# Altium schematic symbol library con-amp.SCHLIB: 238 symbols (part 2 of 3)
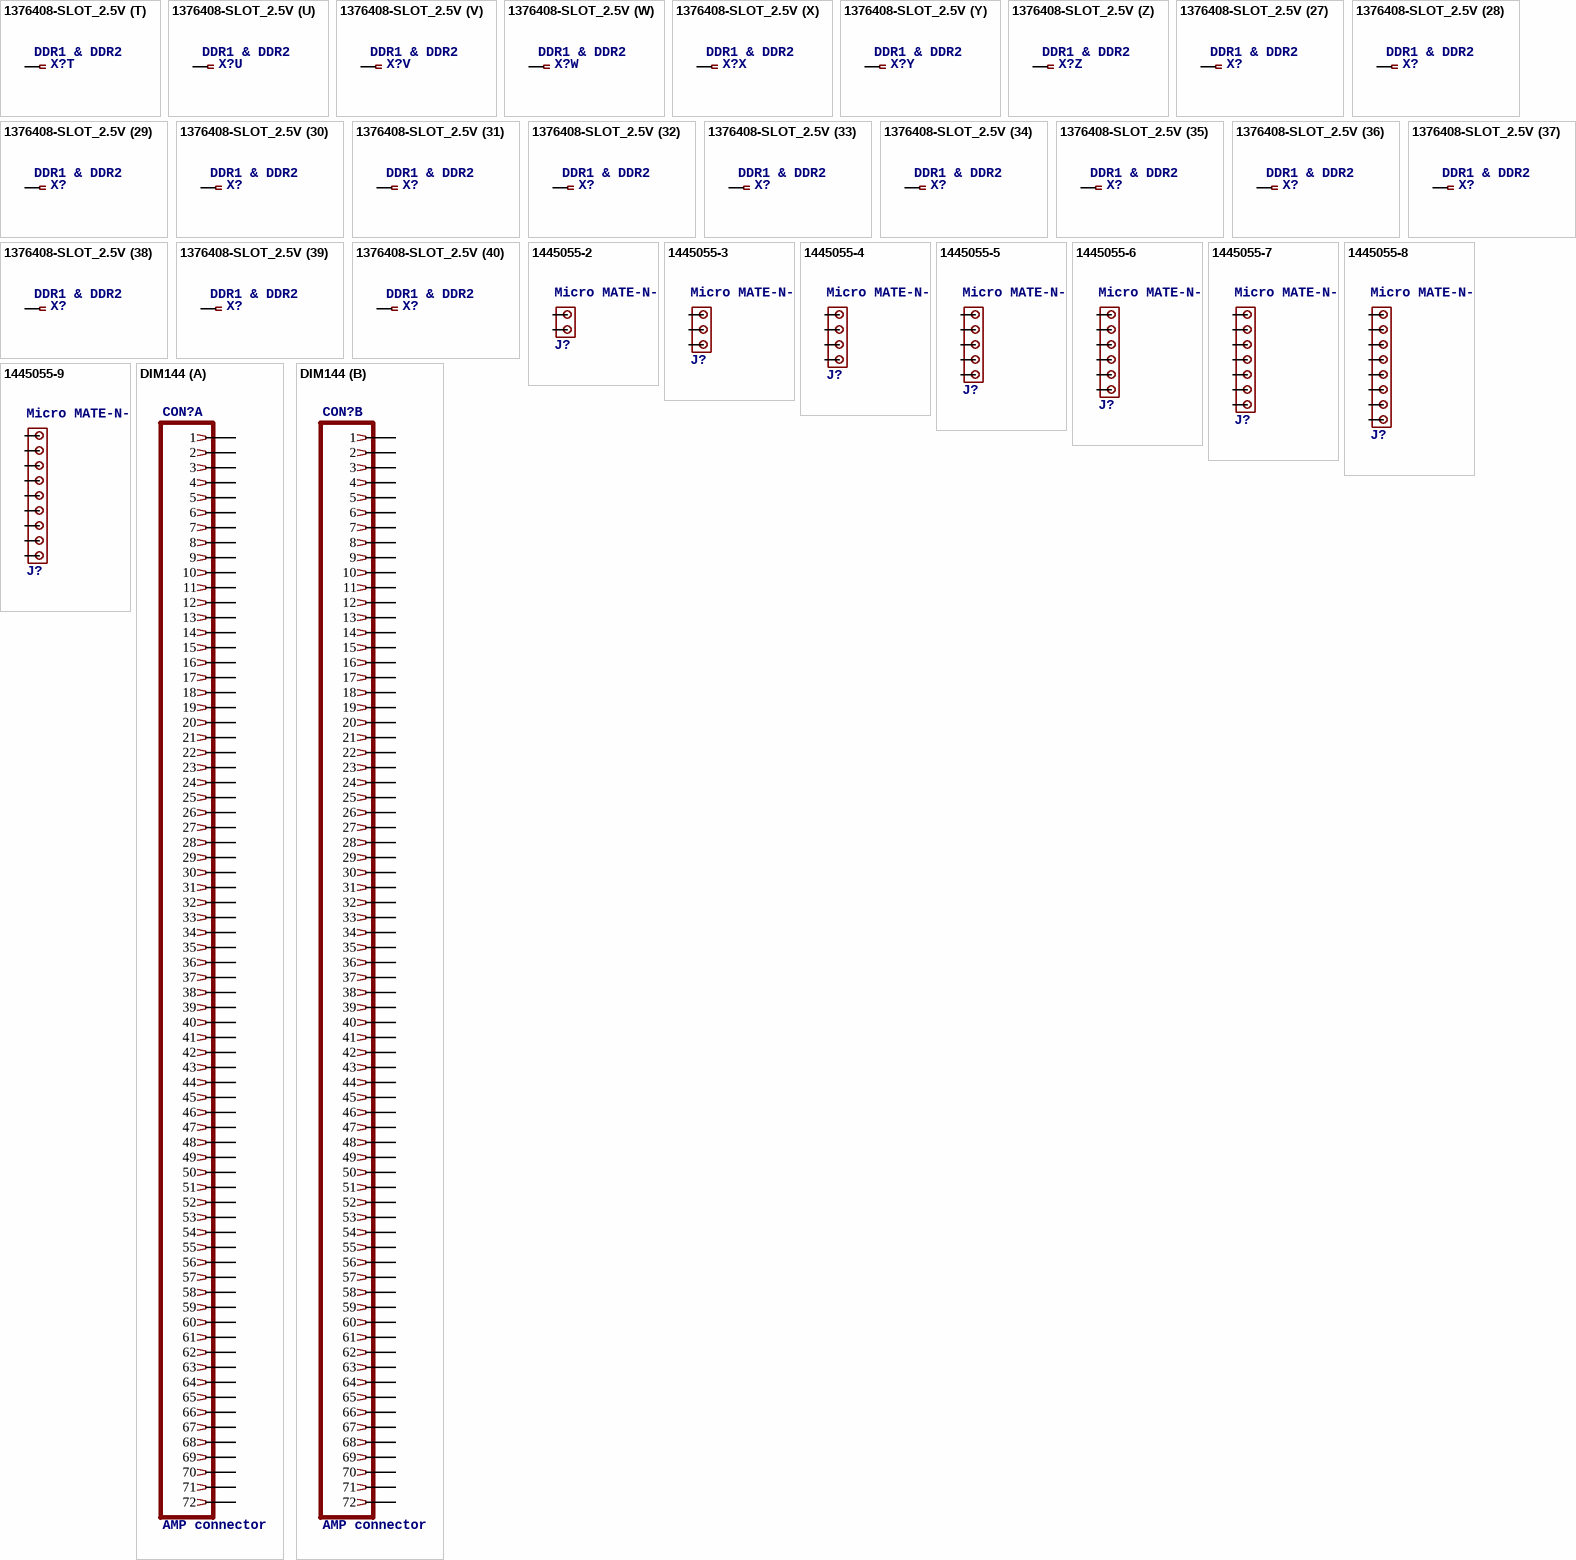
[diagram p35: symbols 1376408-SLOT_2.5V to DIM144]

## 1445055-5
designator J?, comment Micro MATE-N-LOK Connectors grid 1.5 mm   Source: ENG_CD_1445055_A.pdf
footprint 1445055-5
pins: 1, 2, 3, 4, 5

## 1445055-6
designator J?, comment Micro MATE-N-LOK Connectors grid 1.5 mm   Source: ENG_CD_1445055_A.pdf
footprint 1445055-6
pins: 1, 2, 3, 4, 5, 6

## 1445055-7
designator J?, comment Micro MATE-N-LOK Connectors grid 1.5 mm   Source: ENG_CD_1445055_A.pdf
footprint 1445055-7
pins: 1, 2, 3, 4, 5, 6, 7

## 1445055-8
designator J?, comment Micro MATE-N-LOK Connectors grid 1.5 mm   Source: ENG_CD_1445055_A.pdf
footprint 1445055-8
pins: 1, 2, 3, 4, 5, 6, 7, 8

## 1445055-9
designator J?, comment Micro MATE-N-LOK Connectors grid 1.5 mm   Source: ENG_CD_1445055_A.pdf
footprint 1445055-9
pins: 1, 2, 3, 4, 5, 6, 7, 8, 9

## DIM144
designator CON?, comment AMP connector
footprint 390110-1
part A pins: 1, 2, 3, 4, 5, 6, 7, 8, 9, 10, 11, 12, 13, 14, 15, 16, 17, 18, 19, 20, 21, 22, 23, 24, 25, 26, 27, 28, 29, 30, 31, 32, 33, 34, 35, 36, 37, 38, 39, 40, 41, 42, 43, 44, 45, 46, 47, 48, 49, 50, 51, 52, 53, 54, 55, 56, 57, 58, 59, 60, 61, 62, 63, 64, 65, 66, 67, 68, 69, 70, 71, 72
part B pins: 73 1, 74 2, 75 3, 76 4, 77 5, 78 6, 79 7, 80 8, 81 9, 82 10, 83 11, 84 12, 85 13, 86 14, 87 15, 88 16, 89 17, 90 18, 91 19, 92 20, 93 21, 94 22, 95 23, 96 24, 97 25, 98 26, 99 27, 100 28, 101 29, 102 30, 103 31, 104 32, 105 33, 106 34, 107 35, 108 36, 109 37, 110 38, 111 39, 112 40, 113 41, 114 42, 115 43, 116 44, 117 45, 118 46, 119 47, 120 48, 121 49, 122 50, 123 51, 124 52, 125 53, 126 54, 127 55, 128 56, 129 57, 130 58, 131 59, 132 60, 133 61, 134 62, 135 63, 136 64, 137 65, 138 66, 139 67, 140 68, 141 69, 142 70, 143 71, 144 72

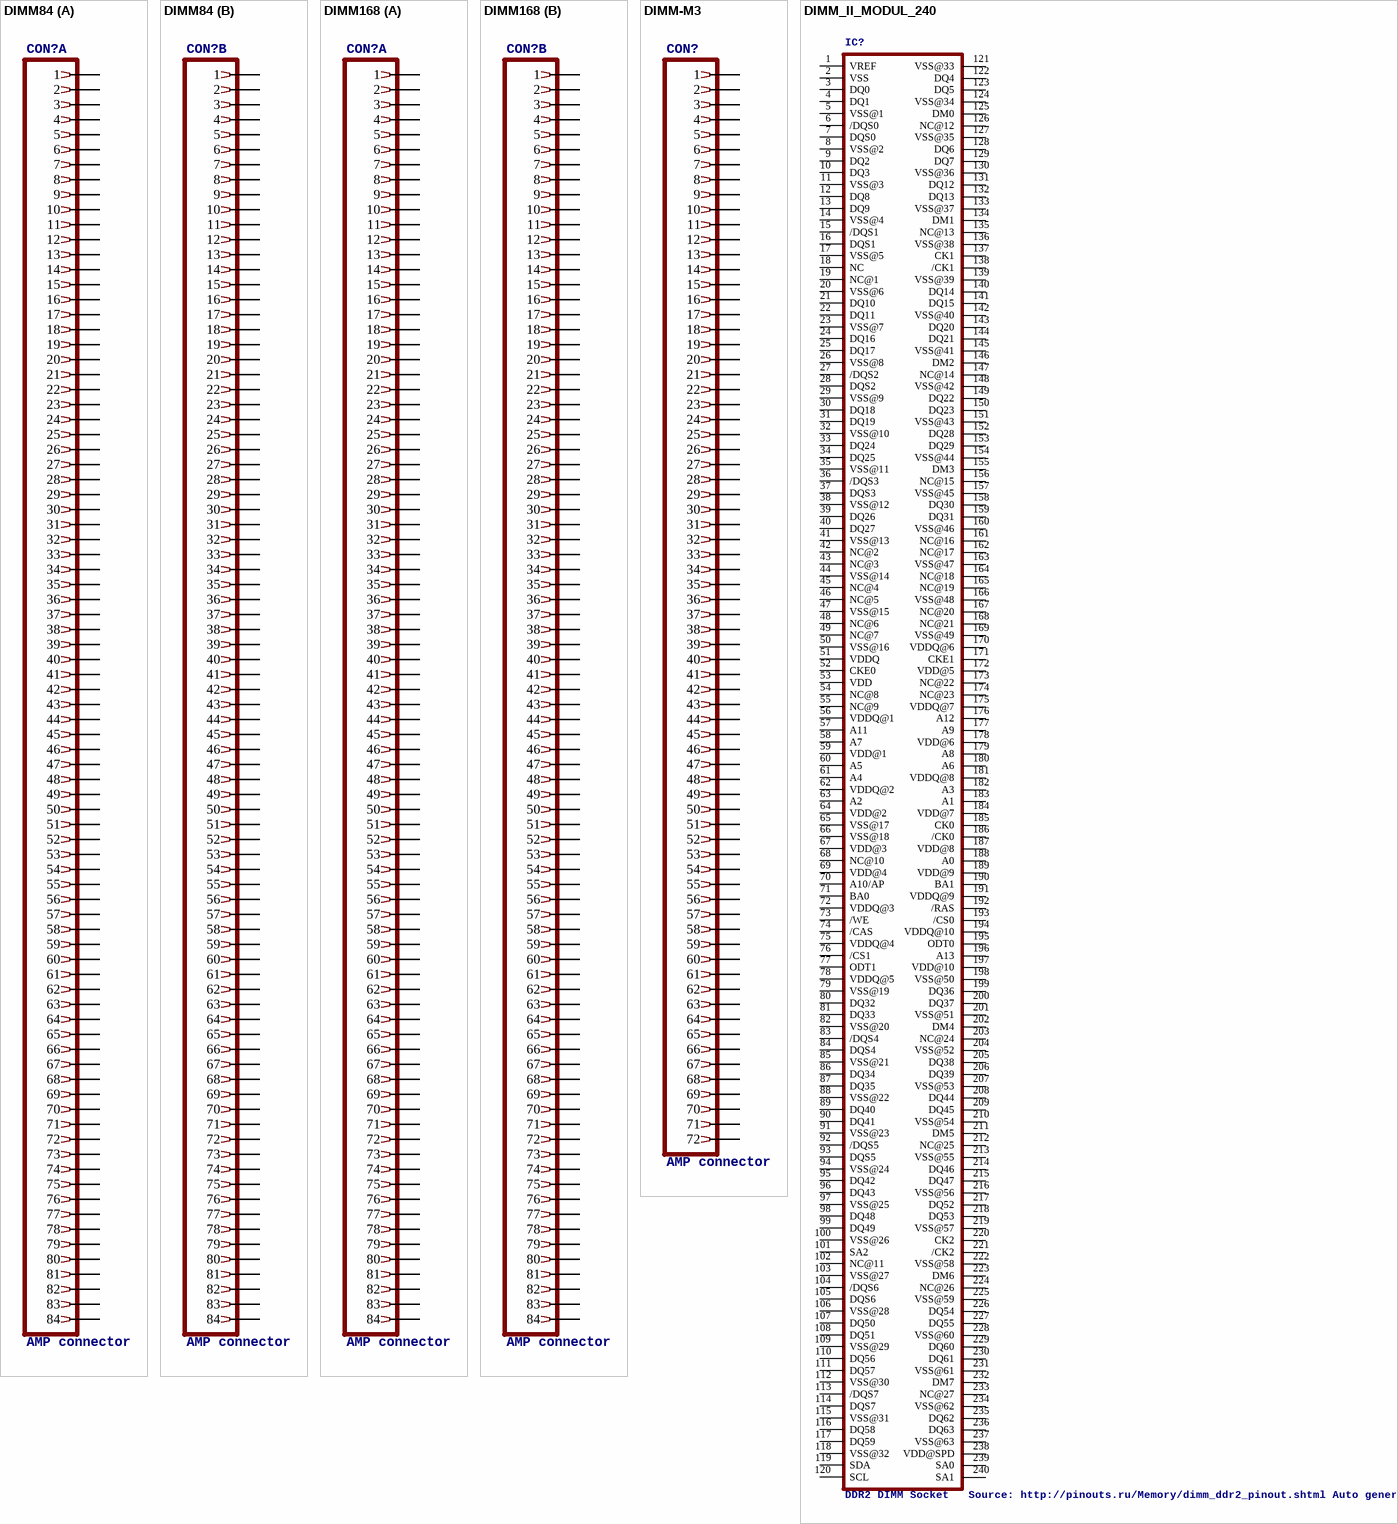
[diagram p11: symbols DIMM84 to DIMM_II_MODUL_240]

## DIMM84
designator CON?, comment AMP connector
footprint 382830-1
part A pins: 1, 2, 3, 4, 5, 6, 7, 8, 9, 10, 11, 12, 13, 14, 15, 16, 17, 18, 19, 20, 21, 22, 23, 24, 25, 26, 27, 28, 29, 30, 31, 32, 33, 34, 35, 36, 37, 38, 39, 40, 41, 42, 43, 44, 45, 46, 47, 48, 49, 50, 51, 52, 53, 54, 55, 56, 57, 58, 59, 60, 61, 62, 63, 64, 65, 66, 67, 68, 69, 70, 71, 72, 73, 74, 75, 76, 77, 78, 79, 80, 81, 82, 83, 84
part B pins: 85 1, 86 2, 87 3, 88 4, 89 5, 90 6, 91 7, 92 8, 93 9, 94 10, 95 11, 96 12, 97 13, 98 14, 99 15, 100 16, 101 17, 102 18, 103 19, 104 20, 105 21, 106 22, 107 23, 108 24, 109 25, 110 26, 111 27, 112 28, 113 29, 114 30, 115 31, 116 32, 117 33, 118 34, 119 35, 120 36, 121 37, 122 38, 123 39, 124 40, 125 41, 126 42, 127 43, 128 44, 129 45, 130 46, 131 47, 132 48, 133 49, 134 50, 135 51, 136 52, 137 53, 138 54, 139 55, 140 56, 141 57, 142 58, 143 59, 144 60, 145 61, 146 62, 147 63, 148 64, 149 65, 150 66, 151 67, 152 68, 153 69, 154 70, 155 71, 156 72, 157 73, 158 74, 159 75, 160 76, 161 77, 162 78, 163 79, 164 80, 165 81, 166 82, 167 83, 168 84

## DIMM168
designator CON?, comment AMP connector
footprint 390052-4
part A pins: 1, 2, 3, 4, 5, 6, 7, 8, 9, 10, 11, 12, 13, 14, 15, 16, 17, 18, 19, 20, 21, 22, 23, 24, 25, 26, 27, 28, 29, 30, 31, 32, 33, 34, 35, 36, 37, 38, 39, 40, 41, 42, 43, 44, 45, 46, 47, 48, 49, 50, 51, 52, 53, 54, 55, 56, 57, 58, 59, 60, 61, 62, 63, 64, 65, 66, 67, 68, 69, 70, 71, 72, 73, 74, 75, 76, 77, 78, 79, 80, 81, 82, 83, 84
part B pins: 85 1, 86 2, 87 3, 88 4, 89 5, 90 6, 91 7, 92 8, 93 9, 94 10, 95 11, 96 12, 97 13, 98 14, 99 15, 100 16, 101 17, 102 18, 103 19, 104 20, 105 21, 106 22, 107 23, 108 24, 109 25, 110 26, 111 27, 112 28, 113 29, 114 30, 115 31, 116 32, 117 33, 118 34, 119 35, 120 36, 121 37, 122 38, 123 39, 124 40, 125 41, 126 42, 127 43, 128 44, 129 45, 130 46, 131 47, 132 48, 133 49, 134 50, 135 51, 136 52, 137 53, 138 54, 139 55, 140 56, 141 57, 142 58, 143 59, 144 60, 145 61, 146 62, 147 63, 148 64, 149 65, 150 66, 151 67, 152 68, 153 69, 154 70, 155 71, 156 72, 157 73, 158 74, 159 75, 160 76, 161 77, 162 78, 163 79, 164 80, 165 81, 166 82, 167 83, 168 84

## DIMM-M3
designator CON?, comment AMP connector
footprint 177827-1
pins: 1, 2, 3, 4, 5, 6, 7, 8, 9, 10, 11, 12, 13, 14, 15, 16, 17, 18, 19, 20, 21, 22, 23, 24, 25, 26, 27, 28, 29, 30, 31, 32, 33, 34, 35, 36, 37, 38, 39, 40, 41, 42, 43, 44, 45, 46, 47, 48, 49, 50, 51, 52, 53, 54, 55, 56, 57, 58, 59, 60, 61, 62, 63, 64, 65, 66, 67, 68, 69, 70, 71, 72

## DIMM_II_MODUL_240
designator IC?, comment DDR2 DIMM Socket   Source: http://pinouts.ru/Memory/dimm_ddr2_pinout.shtml Auto generated by make-symbol-device-package-bsdl.ulp Rev. 20
footprint 1734773-DDR2
pins: 1 VREF, 2 VSS, 3 DQ0, 4 DQ1, 5 VSS@1, 6 /DQS0, 7 DQS0, 8 VSS@2, 9 DQ2, 10 DQ3, 11 VSS@3, 12 DQ8, 13 DQ9, 14 VSS@4, 15 /DQS1, 16 DQS1, 17 VSS@5, 18 NC, 19 NC@1, 20 VSS@6, 21 DQ10, 22 DQ11, 23 VSS@7, 24 DQ16, 25 DQ17, 26 VSS@8, 27 /DQS2, 28 DQS2, 29 VSS@9, 30 DQ18, 31 DQ19, 32 VSS@10, 33 DQ24, 34 DQ25, 35 VSS@11, 36 /DQS3, 37 DQS3, 38 VSS@12, 39 DQ26, 40 DQ27, 41 VSS@13, 42 NC@2, 43 NC@3, 44 VSS@14, 45 NC@4, 46 NC@5, 47 VSS@15, 48 NC@6, 49 NC@7, 50 VSS@16, 51 VDDQ, 52 CKE0, 53 VDD, 54 NC@8, 55 NC@9, 56 VDDQ@1, 57 A11, 58 A7, 59 VDD@1, 60 A5, 61 A4, 62 VDDQ@2, 63 A2, 64 VDD@2, 65 VSS@17, 66 VSS@18, 67 VDD@3, 68 NC@10, 69 VDD@4, 70 A10/AP, 71 BA0, 72 VDDQ@3, 73 /WE, 74 /CAS, 75 VDDQ@4, 76 /CS1, 77 ODT1, 78 VDDQ@5, 79 VSS@19, 80 DQ32, 81 DQ33, 82 VSS@20, 83 /DQS4, 84 DQS4, 85 VSS@21, 86 DQ34, 87 DQ35, 88 VSS@22, 89 DQ40, 90 DQ41, 91 VSS@23, 92 /DQS5, 93 DQS5, 94 VSS@24, 95 DQ42, 96 DQ43, 97 VSS@25, 98 DQ48, 99 DQ49, 100 VSS@26, 101 SA2, 102 NC@11, 103 VSS@27, 104 /DQS6, 105 DQS6, 106 VSS@28, 107 DQ50, 108 DQ51, 109 VSS@29, 110 DQ56, 111 DQ57, 112 VSS@30, 113 /DQS7, 114 DQS7, 115 VSS@31, 116 DQ58, 117 DQ59, 118 VSS@32, 119 SDA, 120 SCL, 121 VSS@33, 122 DQ4, 123 DQ5, 124 VSS@34, 125 DM0, 126 NC@12, 127 VSS@35, 128 DQ6, 129 DQ7, 130 VSS@36, 131 DQ12, 132 DQ13, 133 VSS@37, 134 DM1, 135 NC@13, 136 VSS@38, 137 CK1, 138 /CK1, 139 VSS@39, 140 DQ14, 141 DQ15, 142 VSS@40, 143 DQ20, 144 DQ21, 145 VSS@41, 146 DM2, 147 NC@14, 148 VSS@42, 149 DQ22, 150 DQ23, 151 VSS@43, 152 DQ28, 153 DQ29, 154 VSS@44, 155 DM3, 156 NC@15, 157 VSS@45, 158 DQ30, 159 DQ31, 160 VSS@46, 161 NC@16, 162 NC@17, 163 VSS@47, 164 NC@18, 165 NC@19, 166 VSS@48, 167 NC@20, 168 NC@21, 169 VSS@49, 170 VDDQ@6, 171 CKE1, 172 VDD@5, 173 NC@22, 174 NC@23, 175 VDDQ@7, 176 A12, 177 A9, 178 VDD@6, 179 A8, 180 A6, 181 VDDQ@8, 182 A3, 183 A1, 184 VDD@7, 185 CK0, 186 /CK0, 187 VDD@8, 188 A0, 189 VDD@9, 190 BA1, 191 VDDQ@9, 192 /RAS, 193 /CS0, 194 VDDQ@10, 195 ODT0, 196 A13, 197 VDD@10, 198 VSS@50, 199 DQ36, 200 DQ37, 201 VSS@51, 202 DM4, 203 NC@24, 204 VSS@52, 205 DQ38, 206 DQ39, 207 VSS@53, 208 DQ44, 209 DQ45, 210 VSS@54, 211 DM5, 212 NC@25, 213 VSS@55, 214 DQ46, 215 DQ47, 216 VSS@56, 217 DQ52, 218 DQ53, 219 VSS@57, 220 CK2, 221 /CK2, 222 VSS@58, 223 DM6, 224 NC@26, 225 VSS@59, 226 DQ54, 227 DQ55, 228 VSS@60, 229 DQ60, 230 DQ61, 231 VSS@61, 232 DM7, 233 NC@27, 234 VSS@62, 235 DQ62, 236 DQ63, 237 VSS@63, 238 VDD@SPD, 239 SA0, 240 SA1

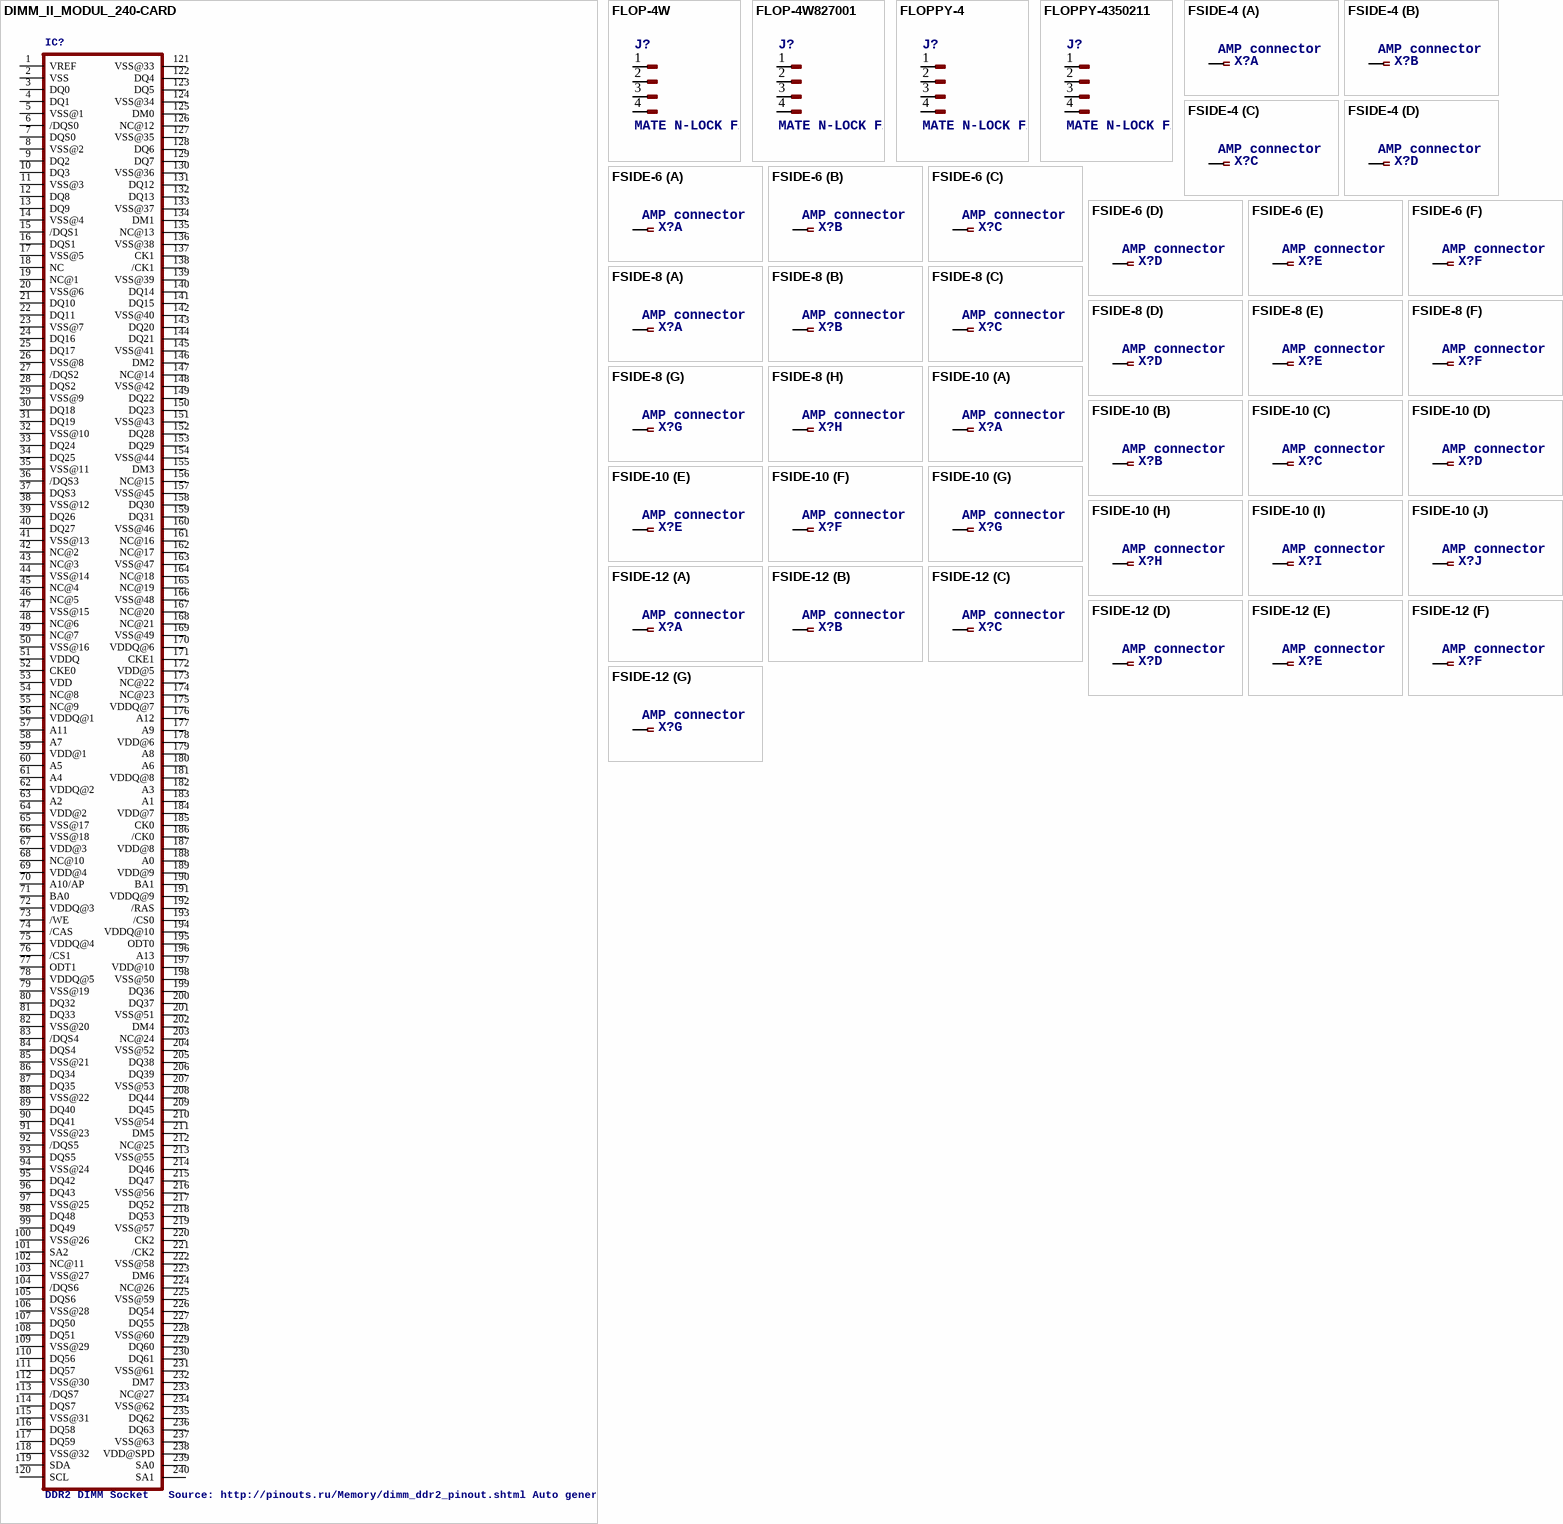
[diagram p12: symbols DIMM_II_MODUL_240-CARD to FSIDE-12]

## DIMM_II_MODUL_240-CARD
designator IC?, comment DDR2 DIMM Socket   Source: http://pinouts.ru/Memory/dimm_ddr2_pinout.shtml Auto generated by make-symbol-device-package-bsdl.ulp Rev. 20
footprint DIMII-240
pins: 1 VREF, 2 VSS, 3 DQ0, 4 DQ1, 5 VSS@1, 6 /DQS0, 7 DQS0, 8 VSS@2, 9 DQ2, 10 DQ3, 11 VSS@3, 12 DQ8, 13 DQ9, 14 VSS@4, 15 /DQS1, 16 DQS1, 17 VSS@5, 18 NC, 19 NC@1, 20 VSS@6, 21 DQ10, 22 DQ11, 23 VSS@7, 24 DQ16, 25 DQ17, 26 VSS@8, 27 /DQS2, 28 DQS2, 29 VSS@9, 30 DQ18, 31 DQ19, 32 VSS@10, 33 DQ24, 34 DQ25, 35 VSS@11, 36 /DQS3, 37 DQS3, 38 VSS@12, 39 DQ26, 40 DQ27, 41 VSS@13, 42 NC@2, 43 NC@3, 44 VSS@14, 45 NC@4, 46 NC@5, 47 VSS@15, 48 NC@6, 49 NC@7, 50 VSS@16, 51 VDDQ, 52 CKE0, 53 VDD, 54 NC@8, 55 NC@9, 56 VDDQ@1, 57 A11, 58 A7, 59 VDD@1, 60 A5, 61 A4, 62 VDDQ@2, 63 A2, 64 VDD@2, 65 VSS@17, 66 VSS@18, 67 VDD@3, 68 NC@10, 69 VDD@4, 70 A10/AP, 71 BA0, 72 VDDQ@3, 73 /WE, 74 /CAS, 75 VDDQ@4, 76 /CS1, 77 ODT1, 78 VDDQ@5, 79 VSS@19, 80 DQ32, 81 DQ33, 82 VSS@20, 83 /DQS4, 84 DQS4, 85 VSS@21, 86 DQ34, 87 DQ35, 88 VSS@22, 89 DQ40, 90 DQ41, 91 VSS@23, 92 /DQS5, 93 DQS5, 94 VSS@24, 95 DQ42, 96 DQ43, 97 VSS@25, 98 DQ48, 99 DQ49, 100 VSS@26, 101 SA2, 102 NC@11, 103 VSS@27, 104 /DQS6, 105 DQS6, 106 VSS@28, 107 DQ50, 108 DQ51, 109 VSS@29, 110 DQ56, 111 DQ57, 112 VSS@30, 113 /DQS7, 114 DQS7, 115 VSS@31, 116 DQ58, 117 DQ59, 118 VSS@32, 119 SDA, 120 SCL, 121 VSS@33, 122 DQ4, 123 DQ5, 124 VSS@34, 125 DM0, 126 NC@12, 127 VSS@35, 128 DQ6, 129 DQ7, 130 VSS@36, 131 DQ12, 132 DQ13, 133 VSS@37, 134 DM1, 135 NC@13, 136 VSS@38, 137 CK1, 138 /CK1, 139 VSS@39, 140 DQ14, 141 DQ15, 142 VSS@40, 143 DQ20, 144 DQ21, 145 VSS@41, 146 DM2, 147 NC@14, 148 VSS@42, 149 DQ22, 150 DQ23, 151 VSS@43, 152 DQ28, 153 DQ29, 154 VSS@44, 155 DM3, 156 NC@15, 157 VSS@45, 158 DQ30, 159 DQ31, 160 VSS@46, 161 NC@16, 162 NC@17, 163 VSS@47, 164 NC@18, 165 NC@19, 166 VSS@48, 167 NC@20, 168 NC@21, 169 VSS@49, 170 VDDQ@6, 171 CKE1, 172 VDD@5, 173 NC@22, 174 NC@23, 175 VDDQ@7, 176 A12, 177 A9, 178 VDD@6, 179 A8, 180 A6, 181 VDDQ@8, 182 A3, 183 A1, 184 VDD@7, 185 CK0, 186 /CK0, 187 VDD@8, 188 A0, 189 VDD@9, 190 BA1, 191 VDDQ@9, 192 /RAS, 193 /CS0, 194 VDDQ@10, 195 ODT0, 196 A13, 197 VDD@10, 198 VSS@50, 199 DQ36, 200 DQ37, 201 VSS@51, 202 DM4, 203 NC@24, 204 VSS@52, 205 DQ38, 206 DQ39, 207 VSS@53, 208 DQ44, 209 DQ45, 210 VSS@54, 211 DM5, 212 NC@25, 213 VSS@55, 214 DQ46, 215 DQ47, 216 VSS@56, 217 DQ52, 218 DQ53, 219 VSS@57, 220 CK2, 221 /CK2, 222 VSS@58, 223 DM6, 224 NC@26, 225 VSS@59, 226 DQ54, 227 DQ55, 228 VSS@60, 229 DQ60, 230 DQ61, 231 VSS@61, 232 DM7, 233 NC@27, 234 VSS@62, 235 DQ62, 236 DQ63, 237 VSS@63, 238 VDD@SPD, 239 SA0, 240 SA1

## FLOP-4W
designator J?, comment MATE N-LOCK Floppy / HDD conector   Distributor: Bürklin 71F972
footprint FLOP-4V
pins: 1, 2, 3, 4

## FLOP-4W827001
designator J?, comment MATE N-LOCK Floppy / HDD conector   Distributor: Bürklin 71F972
footprint 827001
pins: 1, 2, 3, 4

## FLOPPY-4
designator J?, comment MATE N-LOCK Floppy / HDD conector   Distributor: Bürklin 71F970
footprint FLOPPY-4
pins: 1, 2, 3, 4

## FLOPPY-4350211
designator J?, comment MATE N-LOCK Floppy / HDD conector   Distributor: Bürklin 71F970
footprint 350211
pins: 1, 2, 3, 4

## FSIDE-4
designator X?, comment AMP connector
footprint FSIDE-4
part A pins: 1
part B pins: 2 1
part C pins: 3 1
part D pins: 4 1

## FSIDE-6
designator X?, comment AMP connector
footprint FSIDE-6
part A pins: 1
part B pins: 2 1
part C pins: 3 1
part D pins: 4 1
part E pins: 5 1
part F pins: 6 1

## FSIDE-8
designator X?, comment AMP connector
footprint FSIDE-8
part A pins: 1
part B pins: 2 1
part C pins: 3 1
part D pins: 4 1
part E pins: 5 1
part F pins: 6 1
part G pins: 7 1
part H pins: 8 1

## FSIDE-10
designator X?, comment AMP connector
footprint FSIDE-10
part A pins: 1
part B pins: 2 1
part C pins: 3 1
part D pins: 4 1
part E pins: 5 1
part F pins: 6 1
part G pins: 7 1
part H pins: 8 1
part I pins: 9 1
part J pins: 10 1

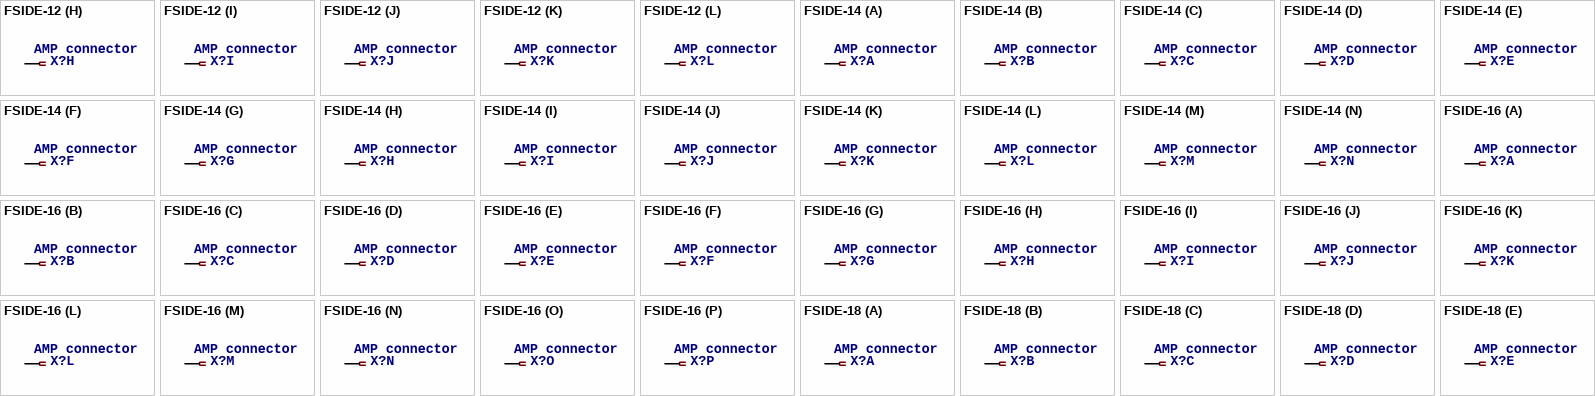
[diagram p13: symbols FSIDE-12 to FSIDE-18]

## FSIDE-12
designator X?, comment AMP connector
footprint FSIDE-12
part A pins: 1
part B pins: 2 1
part C pins: 3 1
part D pins: 4 1
part E pins: 5 1
part F pins: 6 1
part G pins: 7 1
part H pins: 8 1
part I pins: 9 1
part J pins: 10 1
part K pins: 11 1
part L pins: 12 1

## FSIDE-14
designator X?, comment AMP connector
footprint FSIDE-14
part A pins: 1
part B pins: 2 1
part C pins: 3 1
part D pins: 4 1
part E pins: 5 1
part F pins: 6 1
part G pins: 7 1
part H pins: 8 1
part I pins: 9 1
part J pins: 10 1
part K pins: 11 1
part L pins: 12 1
part M pins: 13 1
part N pins: 14 1

## FSIDE-16
designator X?, comment AMP connector
footprint FSIDE-16
part A pins: 1
part B pins: 2 1
part C pins: 3 1
part D pins: 4 1
part E pins: 5 1
part F pins: 6 1
part G pins: 7 1
part H pins: 8 1
part I pins: 9 1
part J pins: 10 1
part K pins: 11 1
part L pins: 12 1
part M pins: 13 1
part N pins: 14 1
part O pins: 15 1
part P pins: 16 1

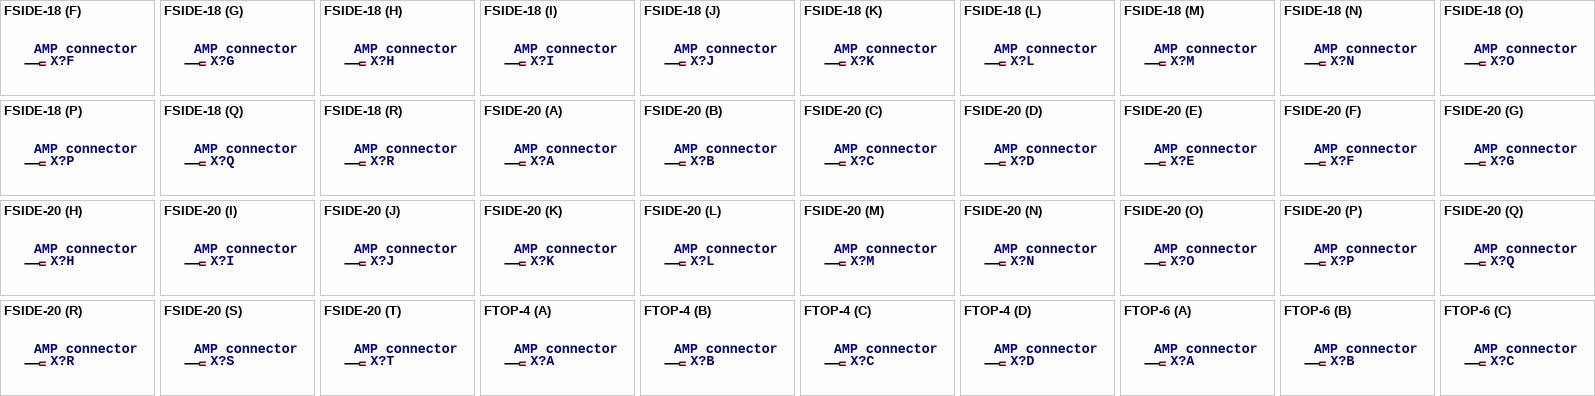
[diagram p14: symbols FSIDE-18 to FTOP-6]

## FSIDE-18
designator X?, comment AMP connector
footprint FSIDE-18
part A pins: 1
part B pins: 2 1
part C pins: 3 1
part D pins: 4 1
part E pins: 5 1
part F pins: 6 1
part G pins: 7 1
part H pins: 8 1
part I pins: 9 1
part J pins: 10 1
part K pins: 11 1
part L pins: 12 1
part M pins: 13 1
part N pins: 14 1
part O pins: 15 1
part P pins: 16 1
part Q pins: 17 1
part R pins: 18 1

## FSIDE-20
designator X?, comment AMP connector
footprint FSIDE-20
part A pins: 1
part B pins: 2 1
part C pins: 3 1
part D pins: 4 1
part E pins: 5 1
part F pins: 6 1
part G pins: 7 1
part H pins: 8 1
part I pins: 9 1
part J pins: 10 1
part K pins: 11 1
part L pins: 12 1
part M pins: 13 1
part N pins: 14 1
part O pins: 15 1
part P pins: 16 1
part Q pins: 17 1
part R pins: 18 1
part S pins: 19 1
part T pins: 20 1

## FTOP-4
designator X?, comment AMP connector
footprint FTOP-4
part A pins: 1
part B pins: 2 1
part C pins: 3 1
part D pins: 4 1

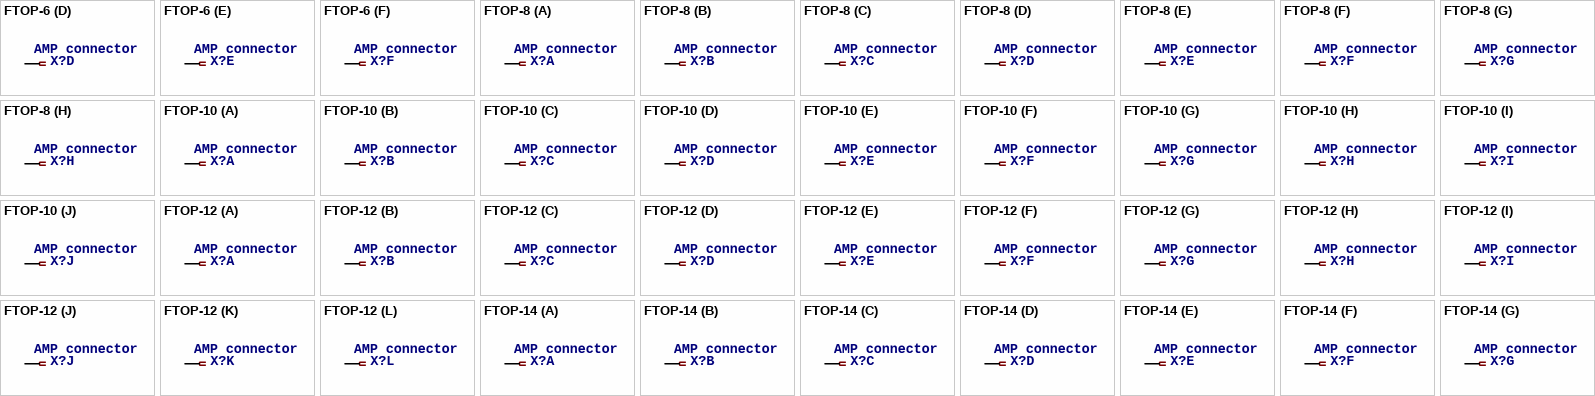
[diagram p15: symbols FTOP-6 to FTOP-14]

## FTOP-6
designator X?, comment AMP connector
footprint FTOP-6
part A pins: 1
part B pins: 2 1
part C pins: 3 1
part D pins: 4 1
part E pins: 5 1
part F pins: 6 1

## FTOP-8
designator X?, comment AMP connector
footprint FTOP-8
part A pins: 1
part B pins: 2 1
part C pins: 3 1
part D pins: 4 1
part E pins: 5 1
part F pins: 6 1
part G pins: 7 1
part H pins: 8 1

## FTOP-10
designator X?, comment AMP connector
footprint FTOP-10
part A pins: 1
part B pins: 2 1
part C pins: 3 1
part D pins: 4 1
part E pins: 5 1
part F pins: 6 1
part G pins: 7 1
part H pins: 8 1
part I pins: 9 1
part J pins: 10 1

## FTOP-12
designator X?, comment AMP connector
footprint FTOP-12
part A pins: 1
part B pins: 2 1
part C pins: 3 1
part D pins: 4 1
part E pins: 5 1
part F pins: 6 1
part G pins: 7 1
part H pins: 8 1
part I pins: 9 1
part J pins: 10 1
part K pins: 11 1
part L pins: 12 1
